# Altium footprint library MCU.PcbLib: 87 footprints (part 3 of 6)
Each footprint in its own frame and in the unit in brackets; x right, y up, seen from the top. Pads: shape width x height; smd on the part's side, far side on the other; paste and mask are expansions set on the pad; w line width, h text height; cw(c..) or ccw(c..) is an arc to the next point about the centre after c.
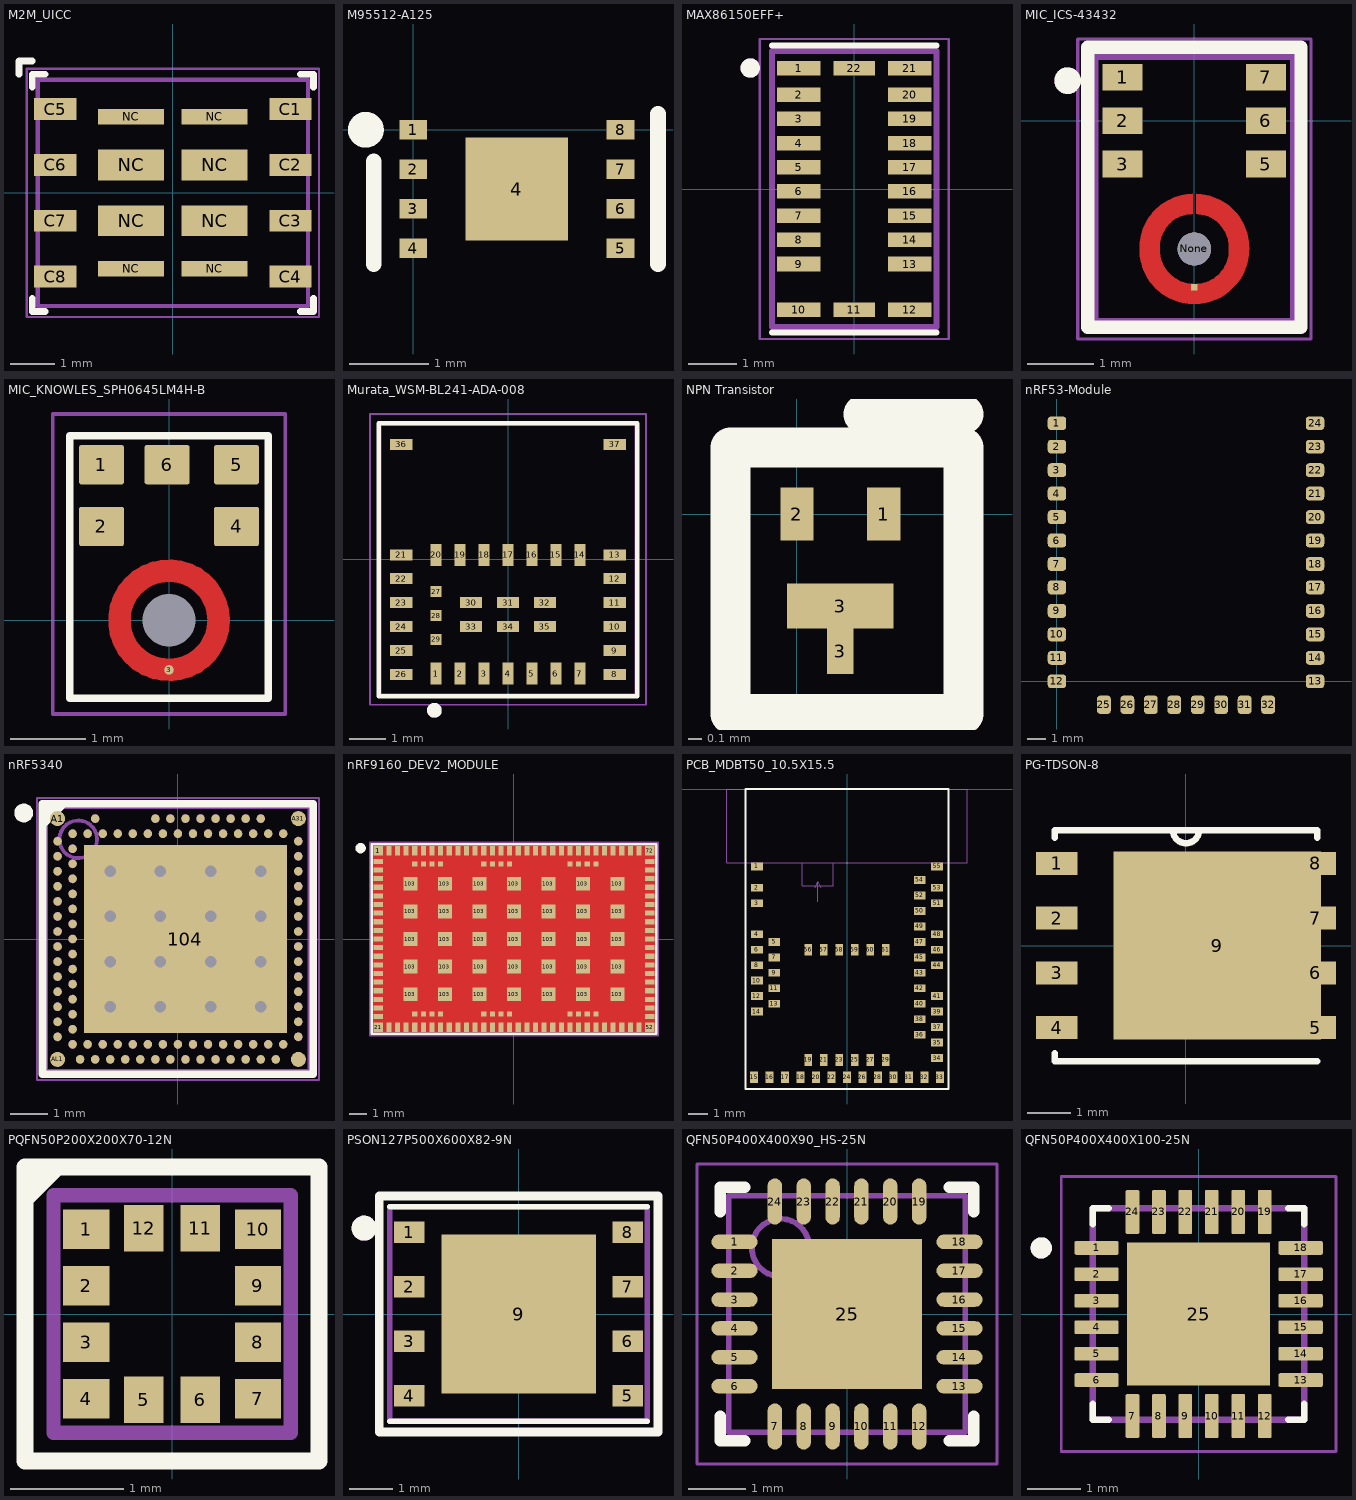
[diagram p2: the footprints below, top view; thin cyan lines are the x and y axes]

## M2M_UICC [mm]
pads (16):
  rect 0.96x0.5 smd: C1(2.675,1.905) C2(2.675,0.635) C3(2.675,-0.635) C4(2.675,-1.905) C5(-2.675,1.905) C6(-2.675,0.635) C7(-2.675,-0.635) C8(-2.675,-1.905)
  rect 1.5x0.7 smd: NC(-0.95,-0.635) NC(-0.95,0.635) NC(0.95,-0.635) NC(0.95,0.635)
  rect 1.5x0.35 smd: NC(-0.95,-1.73) NC(-0.95,1.73) NC(0.95,-1.73) NC(0.95,1.73)
Top Overlay:
  lines w0.15: -3.5,2.7 -3.5,3 -3.2,3 ; -3.2,-2.4 -3.2,-2.7 -2.9,-2.7 ; -3.2,2.4 -3.2,2.7 -2.9,2.7 ; 2.9,-2.7 3.2,-2.7 3.2,-2.4 ; 2.9,2.7 3.2,2.7 3.2,2.4
Mechanical 7:
  lines w0.1: -3.075,-2.575 -3.075,2.575 3.075,2.575 3.075,-2.575 -3.075,-2.575
Mechanical 15:
  circle w0.2: c-2.4,1.9 r0.05
  lines w0.05: -3.325,-2.825 -3.325,2.825 3.325,2.825 3.325,-2.825 -3.325,-2.825
3D body: height 0.5, standoff 0, extent -3.157,-2.674 3.175,2.667

## M95512-A125 [mm] "SPI EPROM"
pads (9):
  rect 0.35x0.25 smd: 1(0,0) 2(0,-0.5) 3(0,-1) 4(0,-1.5) 5(2.625,-1.5) 6(2.625,-1) 7(2.625,-0.5) 8(2.625,0)
  rect 1.3x1.3 smd: 4(1.312,-0.75)
Top Overlay:
  circle w0.254: c-0.6,0 r0.1
  lines w0.2: -0.5,-1.7 -0.5,-0.4 ; 3.1,-1.7 3.1,0.2
3D body "3D Model WFDFPN8.stp": height 0.75, standoff 0, extent -0.191,-1.75 2.809,0.25

## MAX86150EFF+ [mm] "BioSensor"
pads (22):
  rect 0.9x0.3 smd: 1(-1.15,2.5) 2(-1.15,1.95) 3(-1.15,1.45) 4(-1.15,0.95) 5(-1.15,0.45) 6(-1.15,-0.05) 7(-1.15,-0.55) 8(-1.15,-1.05) 9(-1.15,-1.55) 10(-1.15,-2.5) 12(1.15,-2.5) 13(1.15,-1.55) 14(1.15,-1.05) 15(1.15,-0.55) 16(1.15,-0.05) 17(1.15,0.45) 18(1.15,0.95) 19(1.15,1.45) 20(1.15,1.95) 21(1.15,2.5)
  rect 0.85x0.3 smd: 11(0,-2.5) 22(0,2.5)
Top Overlay:
  circle w0.2: c-2.15,2.5 r0.1
  lines w0.127: -1.7,-2.964 1.7,-2.964 ; -1.7,2.964 1.7,2.964
Mechanical 13:
  circle w0.2: c-2.15,2.5 r0.1
  lines w0.127: -1.7,-2.85 1.7,-2.85 1.7,2.85 -1.7,2.85 -1.7,-2.85
Mechanical 15:
  lines w0.05: -1.95,-3.1 1.95,-3.1 1.95,3.1 -1.95,3.1 -1.95,-3.1
3D body "MAX86150EFF---3DModel-STEP-56544.STEP": height 1.4, standoff 0, extent -1.65,-2.8 1.65,2.8

## MIC_ICS-43432 [mm]
pads (8):
  rect 0.6x0.4 smd: 1(-1.075,0.65) 2(-1.075,0) 3(-1.075,-0.65) 5(1.075,-0.65) 6(1.075,0) 7(1.075,0.65)
  rect 0.1x0.1 smd: 4(0,-2.5)
  round 0.5 hole 0.5 unplated: None(0,-1.925)
Top Layer:
  region: 249 vertices and 0 holes, not listed, extent -0.82,-2.75 0.82,-1.1
Top Overlay:
  circle w0.2: c-1.9,0.6 r0.1
  lines w0.2: -1.6,-3.1 -1.6,1.1 1.6,1.1 1.6,-3.1 -1.6,-3.1
Top Paste:
  drawing of 10 lines, arcs and shapes, not listed
Top Solder:
  circle w0.5: c0,-1.925 r0.67
Mechanical 4:
  circle w0.2: c-1.9,0.6 r0.1
  circle w0.2: c-1.9,0.6 r0.1
  lines w0.127: -1.5,-3.025 -1.5,0.975 ; -1.5,-3.025 1.5,-3.025 ; -1.5,-3.025 -1.5,0.975 ; -1.5,-3.025 1.5,-3.025 ; -1.5,0.975 1.5,0.975 ; -1.5,0.975 1.5,0.975 ; 1.5,-3.025 1.5,0.975 ; 1.5,-3.025 1.5,0.975
Mechanical 16:
  lines w0.05: -1.75,-3.275 -1.75,1.225 1.75,1.225 1.75,-3.275 -1.75,-3.275
3D body "ICS-43434.STEP": height 0.98, standoff 0, extent -1.325,-2.95 1.325,0.55

## MIC_KNOWLES_SPH0645LM4H-B [mm] "Microphone KNOWLES SPH0645LM4H-B (170120)"
height 1.08
pads (7):
  rrect10% 0.6x0.522 smd mask+0.05: 1(-0.9,2.074) 2(-0.9,1.252) 4(0.9,1.252) 5(0.9,2.074) 6(-0.025,2.074)
  round 0.127 smd paste+0 mask+0: 3(0,-0.662)
  round 0 hole 0.7 unplated mask+0.508: H1(0,0)
Top Layer:
  circle w0.3: c0,0 r0.662
Top Overlay:
  circle w0.1: c-0.9,2.074 r0.09
  lines w0.1: -1.325,-1.04 -1.325,2.46 1.325,2.46 1.325,-1.04 -1.325,-1.04
Top Paste:
  lines w0.3: -0.616,-0.254 cw(c-0.007,0.005) -0.616,0.263 ; -0.263,-0.616 ccw(c-0.005,-0.007) 0.254,-0.616 ; -0.254,0.616 cw(c0.005,0.007) 0.263,0.616 ; 0.616,-0.263 ccw(c0.007,-0.005) 0.616,0.254
Mechanical 15:
  lines w0.05: -0.2,0 0.2,0 ; 0,-0.2 0,0.2 ; -1.55,-1.25 -1.55,2.75 1.55,2.75 1.55,-1.25 -1.55,-1.25
3D body: height 1.01, standoff 0, extent -0.99,1.985 -0.81,2.165
3D body: height 0.28, standoff 0, extent -1.325,-1.05 1.325,2.45
3D body: height 0.98, standoff 0, extent -1.075,-0.75 1.075,2.15

## Murata_WSM-BL241-ADA-008 [mm]
pads (37):
  rect 0.3x0.6 smd: 1(-1.95,-3.1) 2(-1.3,-3.1) 3(-0.65,-3.1) 4(0,-3.1) 5(0.65,-3.1) 6(1.3,-3.1) 7(1.95,-3.1) 14(1.95,0.125) 15(1.3,0.125) 16(0.65,0.125) 17(0,0.125) 18(-0.65,0.125) 19(-1.3,0.125) 20(-1.95,0.125)
  rect 0.6x0.3 smd: 8(2.9,-3.125) 9(2.9,-2.475) 10(2.9,-1.825) 11(2.9,-1.175) 12(2.9,-0.525) 13(2.9,0.125) 21(-2.9,0.125) 22(-2.9,-0.525) 23(-2.9,-1.175) 24(-2.9,-1.825) 25(-2.9,-2.475) 26(-2.9,-3.125) 30(-1,-1.175) 31(0,-1.175) 32(1,-1.175) 33(-1,-1.825) 34(0,-1.825) 35(1,-1.825) 36(-2.9,3.125) 37(2.9,3.125)
  rect 0.3x0.3 smd: 27(-1.95,-0.875) 28(-1.95,-1.525) 29(-1.95,-2.175)
Top Overlay:
  circle w0.2: c-2,-4.1 r0.1
  lines w0.127: -3.515,-3.715 3.515,-3.715 3.515,3.7 -3.515,3.7 -3.515,-3.715
Mechanical 4:
  circle w0.2: c-2,-4.1 r0.1
  circle w0.2: c-2,-4.1 r0.1
  lines w0.127: -3.5,-3.7 -3.5,3.7 ; -3.5,-3.7 3.5,-3.7 ; -3.5,-3.7 -3.5,3.7 ; -3.5,-3.7 3.5,-3.7 ; -3.5,3.7 3.5,3.7 ; -3.5,3.7 3.5,3.7 ; 3.5,-3.7 3.5,3.7 ; 3.5,-3.7 3.5,3.7
Mechanical 16:
  lines w0.05: -3.75,-3.95 -3.75,3.95 3.75,3.95 3.75,-3.95 -3.75,-3.95
3D body: height 0.76, standoff 0, extent -3.505,-3.708 3.505,3.683

## NPN Transistor [mm] "BC847AQB"
pads (4):
  rect 0.25x0.4 smd: 1(0.65,0) 2(0,0)
  rect 0.2x0.34 smd: 3(0.325,-1.03)
  rect 0.8x0.34 smd: 3(0.325,-0.69)
Top Overlay:
  lines w0.3: 0.5,0.75 1.25,0.75 ; -0.5,-1.5 1.25,-1.5 1.25,0.5 -0.5,0.5 -0.5,-1.5
3D body: height 0.5, standoff 0, extent -0.179,-0.973 0.821,0.027

## nRF53-Module [mm] "Hand Solder version"
pads (32):
  rrect50% 1x0.75 smd: 1(0,13.97) 2(0,12.7) 3(0,11.43) 4(0,10.16) 5(0,8.89) 6(0,7.62) 7(0,6.35) 8(0,5.08) 9(0,3.81) 10(0,2.54) 11(0,1.27) 12(0,0) 13(13.97,0) 14(13.97,1.27) 15(13.97,2.54) 16(13.97,3.81) 17(13.97,5.08) 18(13.97,6.35) 19(13.97,7.62) 20(13.97,8.89) 21(13.97,10.16) 22(13.97,11.43) 23(13.97,12.7) 24(13.97,13.97)
  rrect50% 0.75x1 smd: 25(2.54,-1.27) 26(3.81,-1.27) 27(5.08,-1.27) 28(6.35,-1.27) 29(7.62,-1.27) 30(8.89,-1.27) 31(10.16,-1.27) 32(11.43,-1.27)
3D body "nRF53_Module v4.step": height 2.15, standoff -0.02, extent 0,-1.27 13.97,18.288

## nRF5340 [mm] "Nordic Semiconductor"
pads (115):
  rect 5.4x5 smd paste-5 mask+0.05: 104(0.2,0)
  round 0.4 smd paste+0.012 mask+0.05: A1(-3.2,3.2) A31(3.2,3.2) AL1(-3.2,-3.2) AL31(3.2,-3.2)
  round 0.225 smd paste+0.012 mask+0.05: A5(-2.2,3.2) A13(-0.6,3.2) A15(-0.2,3.2) A17(0.2,3.2) A19(0.6,3.2) A21(1,3.2) A23(1.4,3.2) A25(1.8,3.2) A27(2.2,3.2) AA1(-3.2,-1) AA31(3.2,-1) AB2(-2.8,-1.2) AC1(-3.2,-1.4) AC31(3.2,-1.4) AD2(-2.8,-1.6) AE1(-3.2,-1.8) AE31(3.2,-1.8) AF2(-2.8,-2) AG1(-3.2,-2.2) AG31(3.2,-2.2) AH2(-2.8,-2.4) AJ1(-3.2,-2.6) AJ31(3.2,-2.6) AK2(-2.8,-2.8) AK4(-2.4,-2.8) AK6(-2,-2.8) AK8(-1.6,-2.8) AK10(-1.2,-2.8) AK12(-0.8,-2.8) AK14(-0.4,-2.8) AK16(0,-2.8) AK18(0.4,-2.8) AK20(0.8,-2.8) AK22(1.2,-2.8) AK24(1.6,-2.8) AK26(2,-2.8) AK28(2.4,-2.8) AK30(2.8,-2.8) AL3(-2.6,-3.2) AL5(-2.2,-3.2) AL7(-1.8,-3.2) AL9(-1.4,-3.2) AL11(-1,-3.2) AL13(-0.6,-3.2) AL15(-0.2,-3.2) AL17(0.2,-3.2) AL19(0.6,-3.2) AL21(1,-3.2) AL23(1.4,-3.2) AL25(1.8,-3.2) AL27(2.2,-3.2) AL29(2.6,-3.2) B2(-2.8,2.8) B4(-2.4,2.8) B6(-2,2.8) B8(-1.6,2.8) B10(-1.2,2.8) B12(-0.8,2.8) B14(-0.4,2.8) B16(0,2.8) B18(0.4,2.8) B20(0.8,2.8) B22(1.2,2.8) B24(1.6,2.8) B26(2,2.8) B28(2.4,2.8) B30(2.8,2.8) C1(-3.2,2.6) C31(3.2,2.6) D2(-2.8,2.4) E1(-3.2,2.2) E31(3.2,2.2) F2(-2.8,2) G1(-3.2,1.8) G31(3.2,1.8) H2(-2.8,1.6) J1(-3.2,1.4) J31(3.2,1.4) K2(-2.8,1.2) L1(-3.2,1) L31(3.2,1) M2(-2.8,0.8) N1(-3.2,0.6) N31(3.2,0.6) P2(-2.8,0.4) R1(-3.2,0.2) R31(3.2,0.2) T2(-2.8,0) U1(-3.2,-0.2) U31(3.2,-0.2) V2(-2.8,-0.4) W1(-3.2,-0.6) W31(3.2,-0.6) Y2(-2.8,-0.8)
  rrect50% 1.1x1 on Top Paste: ""(-1.75,-1.8) ""(-1.75,-0.6) ""(-1.75,0.6) ""(-1.75,1.8) ""(-0.45,-1.8) ""(-0.45,-0.6) ""(-0.45,0.6) ""(-0.45,1.8) ""(0.85,-1.8) ""(0.85,-0.6) ""(0.85,0.6) ""(0.85,1.8) ""(2.15,-1.8) ""(2.15,-0.6) ""(2.15,0.6) ""(2.15,1.8)
via -1.8,1.8 diameter 0.61 hole 0.305
via -0.467,1.8 diameter 0.61 hole 0.305
via 0.867,1.8 diameter 0.61 hole 0.305
via 2.2,1.8 diameter 0.61 hole 0.305
via -1.8,0.6 diameter 0.61 hole 0.305
via -0.467,0.6 diameter 0.61 hole 0.305
via 0.867,0.6 diameter 0.61 hole 0.305
via 2.2,0.6 diameter 0.61 hole 0.305
via -1.8,-0.6 diameter 0.61 hole 0.305
via -0.467,-0.6 diameter 0.61 hole 0.305
via 0.867,-0.6 diameter 0.61 hole 0.305
via 2.2,-0.6 diameter 0.61 hole 0.305
via -1.8,-1.8 diameter 0.61 hole 0.305
via -0.467,-1.8 diameter 0.61 hole 0.305
via 0.867,-1.8 diameter 0.61 hole 0.305
via 2.2,-1.8 diameter 0.61 hole 0.305
Top Overlay:
  circle w0.25: c-4.1,3.35 r0.125
  region: -3,3.5 -3.5,3 -3.5,3.5
  lines w0.2: -3.6,-3.6 -3.6,3.6 3.6,3.6 3.6,-3.6 -3.6,-3.6
Mechanical 5:
  drawing of 564 lines, arcs and shapes, not listed
  text "AG1" at -3.541,-2.24 h0.08
  text "AJ1" at -3.541,-2.64 h0.08
  text "AH2" at -3.208,-2.44 h0.08
  text "AK4" at -2.508,-3.039 h0.08
  text "AL5" at -2.315,-3.439 h0.08
  text "AK2" at -2.908,-3.013 h0.08
  text "AL3" at -2.715,-3.439 h0.08
  text "V2" at -3.128,-0.44 h0.08
  text "U1" at -3.469,-0.24 h0.08
  text "Y2" at -3.128,-0.84 h0.08
  text "AA1" at -3.534,-1.04 h0.08
  text "W1" at -3.469,-0.64 h0.08
  text "AD2" at -3.208,-1.64 h0.08
  text "AC1" at -3.541,-1.44 h0.08
  text "AE1" at -3.521,-1.84 h0.08
  text "AB2" at -3.208,-1.24 h0.08
  text "H2" at -3.128,1.56 h0.08
  text "J1" at -3.469,1.36 h0.08
  text "G1" at -3.469,1.76 h0.08
  text "M2" at -3.128,0.76 h0.08
  text "L1" at -3.489,0.96 h0.08
  text "P2" at -3.128,0.36 h0.08
  text "R1" at -3.456,0.16 h0.08
  text "N1" at -3.449,0.56 h0.08
  text "K2" at -3.128,1.16 h0.08
  text "D2" at -3.128,2.36 h0.08
  text "E1" at -3.449,2.16 h0.08
  text "C1" at -3.469,2.56 h0.08
  text "B4" at -2.469,2.961 h0.08
  text "A5" at -2.272,3.361 h0.08
  text "B2" at -2.853,2.947 h0.08
  text "AK14" at -0.538,-3.039 h0.08
  text "AL13" at -0.744,-3.439 h0.08
  text "AK10" at -1.338,-3.04 h0.08
  text "AL11" at -1.144,-3.439 h0.08
  text "AK12" at -0.938,-3.039 h0.08
  text "AK8" at -1.708,-3.039 h0.08
  text "AL7" at -1.915,-3.439 h0.08
  text "AL9" at -1.544,-3.439 h0.08
  text "AL15" at -0.344,-3.439 h0.08
  text "B14" at -0.498,2.961 h0.08
  text "A13" at -0.702,3.36 h0.08
  text "B10" at -1.298,2.961 h0.08
  text "B12" at -0.898,2.961 h0.08
  text "B8" at -1.669,2.961 h0.08
  text "A15" at -0.302,3.361 h0.08
  text "AK24" at 1.462,-3.039 h0.08
  text "AL23" at 1.256,-3.439 h0.08
  text "AL25" at 1.656,-3.439 h0.08
  text "AK20" at 0.662,-3.04 h0.08
  text "AL21" at 0.856,-3.439 h0.08
  text "AK18" at 0.262,-3.039 h0.08
  text "AL17" at 0.056,-3.439 h0.08
  text "AL19" at 0.456,-3.439 h0.08
  text "AK22" at 1.062,-3.039 h0.08
  text "B24" at 1.502,2.961 h0.08
  text "A23" at 1.298,3.36 h0.08
  text "A25" at 1.698,3.361 h0.08
  text "B20" at 0.702,2.961 h0.08
  text "A21" at 0.898,3.36 h0.08
  text "B18" at 0.302,2.961 h0.08
  text "A17" at 0.098,3.361 h0.08
  text "A19" at 0.498,3.361 h0.08
  text "B22" at 1.102,2.961 h0.08
  text "AL29" at 2.456,-3.439 h0.08
  text "AL27" at 2.056,-3.439 h0.08
  text "AK28" at 2.262,-3.039 h0.08
  text "AG31" at 3.322,-2.24 h0.08
  text "AJ31" at 3.322,-2.64 h0.08
  text "AK30" at 2.662,-3.039 h0.08
  text "U31" at 3.322,-0.24 h0.08
  text "AA31" at 3.322,-1.04 h0.08
  text "W31" at 3.322,-0.64 h0.08
  text "AC31" at 3.322,-1.44 h0.08
  text "AE31" at 3.322,-1.84 h0.08
  text "J31" at 3.322,1.36 h0.08
  text "G31" at 3.322,1.76 h0.08
  text "L31" at 3.322,0.96 h0.08
  text "R31" at 3.322,0.16 h0.08
  text "N31" at 3.322,0.56 h0.08
  text "E31" at 3.322,2.16 h0.08
  text "C31" at 3.322,2.56 h0.08
  text "B30" at 2.702,2.961 h0.08
  text "A27" at 2.098,3.361 h0.08
  text "B28" at 2.302,2.961 h0.08
  text "AF2" at -3.208,-2.04 h0.08
  text "F2" at -3.128,1.96 h0.08
  text "T2" at -3.128,-0.04 h0.08
  text "AK6" at -2.108,-3.039 h0.08
  text "B6" at -2.069,2.961 h0.08
  text "AK26" at 1.862,-3.039 h0.08
  text "AK16" at -0.138,-3.039 h0.08
  text "B26" at 1.902,2.961 h0.08
  text "B16" at -0.098,2.961 h0.08
Mechanical 7:
  circle w0.1: c-2.65,2.65 r0.5
  lines w0.1: -3.5,-3.5 3.5,-3.5 3.5,3.5 -3.5,3.5 -3.5,-3.5
  text ".Designator" at -3.2,-0.3 h0.64
Mechanical 15:
  lines w0.05: -3.75,-3.75 3.75,-3.75 3.75,3.75 -3.75,3.75 -3.75,-3.75
  lines w0.1: -0.3,0 0.7,0 ; 0.2,-0.5 0.2,0.5
3D body "aQFN-116 (7x7).step": height 0.85, standoff -0.05, extent -3.5,-3.5 3.5,3.5

## nRF9160_DEV2_MODULE [mm]
pads (161):
  rect 0.54x0.54 smd mask+0.05: 1(-7.87,5.12) 21(-7.87,-5.12) 52(7.87,-5.12) 72(7.87,5.12)
  rect 0.54x0.3 smd mask+0.05: 2(-7.87,4.5) 3(-7.87,4) 4(-7.87,3.5) 5(-7.87,3) 6(-7.87,2.5) 7(-7.87,2) 8(-7.87,1.5) 9(-7.87,1) 10(-7.87,0.5) 11(-7.87,0) 12(-7.87,-0.5) 13(-7.87,-1) 14(-7.87,-1.5) 15(-7.87,-2) 16(-7.87,-2.5) 17(-7.87,-3) 18(-7.87,-3.5) 19(-7.87,-4) 20(-7.87,-4.5) 53(7.87,-4.5) 54(7.87,-4) 55(7.87,-3.5) 56(7.87,-3) 57(7.87,-2.5) 58(7.87,-2) 59(7.87,-1.5) 60(7.87,-1) 61(7.87,-0.5) 62(7.87,0) 63(7.87,0.5) 64(7.87,1) 65(7.87,1.5) 66(7.87,2) 67(7.87,2.5) 68(7.87,3) 69(7.87,3.5) 70(7.87,4) 71(7.87,4.5)
  rect 0.3x0.54 smd mask+0.05: 22(-7.25,-5.12) 23(-6.75,-5.12) 24(-6.25,-5.12) 25(-5.75,-5.12) 26(-5.25,-5.12) 27(-4.75,-5.12) 28(-4.25,-5.12) 29(-3.75,-5.12) 30(-3.25,-5.12) 31(-2.75,-5.12) 32(-2.25,-5.12) 33(-1.75,-5.12) 34(-1.25,-5.12) 35(-0.75,-5.12) 36(-0.25,-5.12) 37(0.25,-5.12) 38(0.75,-5.12) 39(1.25,-5.12) 40(1.75,-5.12) 41(2.25,-5.12) 42(2.75,-5.12) 43(3.25,-5.12) 44(3.75,-5.12) 45(4.25,-5.12) 46(4.75,-5.12) 47(5.25,-5.12) 48(5.75,-5.12) 49(6.25,-5.12) 50(6.75,-5.12) 51(7.25,-5.12) 73(7.25,5.12) 74(6.75,5.12) 75(6.25,5.12) 76(5.75,5.12) 77(5.25,5.12) 78(4.75,5.12) 79(4.25,5.12) 80(3.75,5.12) 81(3.25,5.12) 82(2.75,5.12) 83(2.25,5.12) 84(1.75,5.12) 85(1.25,5.12) 86(0.75,5.12) 87(0.25,5.12) 88(-0.25,5.12) 89(-0.75,5.12) 90(-1.25,5.12) 91(-1.75,5.12) 92(-2.25,5.12) 93(-2.75,5.12) 94(-3.25,5.12) 95(-3.75,5.12) 96(-4.25,5.12) 97(-4.75,5.12) 98(-5.25,5.12) 99(-5.75,5.12) 100(-6.25,5.12) 101(-6.75,5.12) 102(-7.25,5.12)
  rect 0.8x0.8 smd mask+0.05: 103(-6,-3.2) 103(-6,-1.6) 103(-6,0) 103(-6,1.6) 103(-6,3.2) 103(-4,-3.2) 103(-4,-1.6) 103(-4,0) 103(-4,1.6) 103(-4,3.2) 103(-2,-3.2) 103(-2,-1.6) 103(-2,0) 103(-2,1.6) 103(-2,3.2) 103(0,-3.2) 103(0,-1.6) 103(0,0) 103(0,1.6) 103(0,3.2) 103(2,-3.2) 103(2,-1.6) 103(2,0) 103(2,1.6) 103(2,3.2) 103(4,-3.2) 103(4,-1.6) 103(4,0) 103(4,1.6) 103(4,3.2) 103(6,-3.2) 103(6,-1.6) 103(6,0) 103(6,1.6) 103(6,3.2)
  rect 0.3x0.3 smd mask+0.05: 104(-5.75,-4.35) 105(-5.25,-4.35) 106(-4.75,-4.35) 107(-4.25,-4.35) 108(-1.75,-4.35) 109(-1.25,-4.35) 110(-0.75,-4.35) 111(-0.25,-4.35) 112(3.25,-4.35) 113(3.75,-4.35) 114(4.25,-4.35) 115(4.75,-4.35) 116(4.75,4.35) 117(4.25,4.35) 118(3.75,4.35) 119(3.25,4.35) 120(-0.25,4.35) 121(-0.75,4.35) 122(-1.25,4.35) 123(-1.75,4.35) 124(-4.25,4.35) 125(-4.75,4.35) 126(-5.25,4.35) 127(-5.75,4.35)
Top Layer:
  pour cut-out: -8.15,5.4 8.15,5.4 8.15,-5.4 -8.15,-5.4
Top Overlay:
  circle w0.3: c-8.89,5.265 r0.15
  lines w0.15: -8.25,-5.5 -8.25,5.5 8.25,5.5 8.25,-5.5 -8.25,-5.5
Mechanical 5:
  text ".Comment" at -5.4,-2.45 h0.9
Mechanical 7:
  circle w0.3: c-6.5,3.75 r0.15
  lines w0.1: -8.05,-5.3 -8.05,5.3 8.05,5.3 8.05,-5.3 -8.05,-5.3
  text ".Designator" at -0.878,-0.289 h1.5
Mechanical 15:
  circle w0.3: c-6.5,3.75 r0.15
  lines w0.1: -8.35,-5.6 -8.35,5.6 8.35,5.6 8.35,-5.6 -8.35,-5.6
3D body "nRF9160_v4.step": height 1.2, standoff 0, extent -8.05,-5.3 8.05,5.3

## PCB_MDBT50_10.5X15.5 [mm]
pads (61):
  rect 0.6x0.4 smd mask+0.05: 1(-4.65,-4) 2(-4.65,-5.1) 3(-4.65,-5.9) 4(-4.65,-7.5) 5(-3.75,-7.9) 6(-4.65,-8.3) 7(-3.75,-8.7) 8(-4.65,-9.1) 9(-3.75,-9.5) 10(-4.65,-9.9) 11(-3.75,-10.3) 12(-4.65,-10.7) 13(-3.75,-11.1) 14(-4.65,-11.5) 34(4.65,-13.9) 35(4.65,-13.1) 36(3.75,-12.7) 37(4.65,-12.3) 38(3.75,-11.9) 39(4.65,-11.5) 40(3.75,-11.1) 41(4.65,-10.7) 42(3.75,-10.3) 43(3.75,-9.5) 44(4.65,-9.1) 45(3.75,-8.7) 46(4.65,-8.3) 47(3.75,-7.9) 48(4.65,-7.5) 49(3.75,-7.1) 50(3.75,-6.3) 51(4.65,-5.9) 52(3.75,-5.5) 53(4.65,-5.1) 54(3.75,-4.7) 55(4.65,-4)
  rect 0.4x0.6 smd mask+0.05: 15(-4.8,-14.9) 16(-4,-14.9) 17(-3.2,-14.9) 18(-2.4,-14.9) 19(-2,-14) 20(-1.6,-14.9) 21(-1.2,-14) 22(-0.8,-14.9) 23(-0.4,-14) 24(0,-14.9) 25(0.4,-14) 26(0.8,-14.9) 27(1.2,-14) 28(1.6,-14.9) 29(2,-14) 30(2.4,-14.9) 31(3.2,-14.9) 32(4,-14.9) 33(4.8,-14.9) 56(-2,-8.3) 57(-1.2,-8.3) 58(-0.4,-8.3) 59(0.4,-8.3) 60(1.2,-8.3) 61(2,-8.3)
Top Overlay:
  lines w0.1: -5.25,-15.5 -5.25,0 0,0 5.25,0 5.25,-15.5 -5.25,-15.5
Mechanical 2:
  lines w0.05: -6.2,-3.8 6.2,-3.8 6.2,0 -6.2,0 -6.2,-3.8
  text "No ground pad" at -2.801,-1.775 h0.45
Mechanical 3:
  lines w0.05: -1.65,-5.098 -1.5,-4.798 ; -1.5,-5.823 -1.5,-4.798 ; -1.35,-5.098 -1.5,-4.798 ; -2.3,-5 -0.7,-5 -0.7,-3.8 -2.3,-3.8 -2.3,-5
  text "Toplayer no ground pad" at -3.4,-6.225 h0.3
3D body "MDBT50Q 3D Drawing_20180620.stp": height 2.05, standoff 0, extent -5.3,-15.55 5.2,-0.05

## PG-TDSON-8 [mil]
pads (9):
  rect 38x21 smd: 1(-118,75) 2(-118,25) 3(-118,-25) 4(-118,-75) 5(118,-75) 6(118,-25) 7(118,25) 8(118,75)
  rect 189.17x171.65 smd mask+0: 9(28.54,0)
Top Overlay:
  lines w6: -120,-98.6 -120,-105.5 120,-105.5 ; -120,98.6 -120,105.5 120,105.5 120,98.6 ; -12,105.5 ccw(c0,105.5) 12,105.5
Top Paste:
  region: -58.26,-86.5 -58.26,86.5 107.09,86.5 107.09,-86.5
Top Solder:
  region: -58.26,-86.5 -58.26,86.5 107.09,86.5 107.09,-86.5
3D body "Infineon-STP_PG-TDSON-8-17-P-v01_00-EN.stp": height 39.76, standoff 0, extent -121.06,-101.39 121.07,101.37

## PQFN50P200X200X70-12N [mm]
pads (12):
  rect 0.41x0.35 smd: 1(-0.76,0.75) 2(-0.76,0.25) 3(-0.76,-0.25) 4(-0.76,-0.75) 7(0.76,-0.75) 8(0.76,-0.25) 9(0.76,0.25) 10(0.76,0.75)
  rect 0.35x0.41 smd: 5(-0.25,-0.76) 6(0.25,-0.76) 11(0.25,0.76) 12(-0.25,0.76)
Top Overlay:
  region: -1.232,0.978 -0.978,1.232 -1.119,1.373 -1.373,1.119
  lines w0.15: -1.3,-1.3 -1.3,1.3 1.3,1.3 1.3,-1.3 -1.3,-1.3
Mechanical 4:
  lines w0.127: -1.05,-1.05 -1.05,1.05 ; -1.05,-1.05 1.05,-1.05 ; -1.05,-1.05 -1.05,1.05 ; -1.05,-1.05 1.05,-1.05 ; -1.05,1.05 1.05,1.05 ; -1.05,1.05 1.05,1.05 ; 1.05,-1.05 1.05,1.05 ; 1.05,-1.05 1.05,1.05
Mechanical 16:
  lines w0.05: -1.3,-1.3 1.3,-1.3 1.3,1.3 -1.3,1.3 -1.3,-1.3
3D body "IIS2MDCTR--3DModel-STEP-56544.STEP": height 0.7, standoff 0, extent -1,-1 1,1

## PSON127P500X600X82-9N [mm]
pads (9):
  rect 0.71x0.51 smd: 1(-2.55,1.905) 2(-2.55,0.635) 3(-2.55,-0.635) 4(-2.55,-1.905) 5(2.55,-1.905) 6(2.55,-0.635) 7(2.55,0.635) 8(2.55,1.905)
  rect 3.6x3.7 smd paste-3: 9(0,0)
Top Overlay:
  circle w0.3: c-3.6,2 r0.141
  lines w0.127: -3,-2.5 3,-2.5 ; -3,2.5 3,2.5
  lines w0.2: -3.25,-2.75 -3.25,2.75 3.25,2.75 3.25,-2.75 -3.25,-2.75
Top Paste:
  region: 1.5,-1.45 0.18,-1.45 0.18,-0.18 1.5,-0.18
  region: -0.18,-1.45 -1.5,-1.45 -1.5,-0.18 -0.18,-0.18
  region: 1.5,0.18 0.18,0.18 0.18,1.45 1.5,1.45
  region: -0.18,0.18 -1.5,0.18 -1.5,1.45 -0.18,1.45
Mechanical 13:
  circle w0.3: c-3.6,2 r0.141
  lines w0.127: -3,-2.5 -3,2.5 3,2.5 3,-2.5 -3,-2.5
3D body "SIM-ST-MFF2--3DModel-STEP-56544.STEP": height 0.82, standoff 0, extent -3,-2.5 3,2.5

## QFN50P400X400X90_HS-25N [mm] "QFN, 24-Leads, Body 4.00x4.00mm, Pitch 0.50mm, Thermal Pad 2.60x2.70mm, IPC Medium Density"
height 0.9
pads (25):
  oval 0.8x0.25 smd: 1(-1.95,1.25) 2(-1.95,0.75) 3(-1.95,0.25) 4(-1.95,-0.25) 5(-1.95,-0.75) 6(-1.95,-1.25) 13(1.95,-1.25) 14(1.95,-0.75) 15(1.95,-0.25) 16(1.95,0.25) 17(1.95,0.75) 18(1.95,1.25)
  oval 0.25x0.8 smd: 7(-1.25,-1.95) 8(-0.75,-1.95) 9(-0.25,-1.95) 10(0.25,-1.95) 11(0.75,-1.95) 12(1.25,-1.95) 19(1.25,1.95) 20(0.75,1.95) 21(0.25,1.95) 22(-0.25,1.95) 23(-0.75,1.95) 24(-1.25,1.95)
  rect 2.6x2.6 smd: 25(0,0)
Top Overlay:
  lines w0.2: -2.2,-1.775 -2.2,-2.2 -1.775,-2.2 ; -2.2,1.775 -2.2,2.2 -1.775,2.2 ; 1.775,-2.2 2.2,-2.2 2.2,-1.775 ; 1.775,2.2 2.2,2.2 2.2,1.775
Mechanical 13:
  circle w0.1: c-1.15,1.15 r0.5
  lines w0.1: -2.05,-2.05 2.05,-2.05 2.05,2.05 -2.05,2.05 -2.05,-2.05
Mechanical 15:
  lines w0.05: -2.6,-2.6 2.6,-2.6 2.6,2.6 -2.6,2.6 -2.6,-2.6
  lines w0.1: -0.5,0 0.5,0 ; 0,-0.5 0,0.5
3D body "QFN50P400X400X90_HS-25N.step": height 0.9, standoff 0, extent -2.051,-2.051 2.051,2.051

## QFN50P400X400X100-25N [mm]
pads (25):
  rrect25% 0.84x0.26 smd: 1(-1.93,1.25) 2(-1.93,0.75) 3(-1.93,0.25) 4(-1.93,-0.25) 5(-1.93,-0.75) 6(-1.93,-1.25) 13(1.93,-1.25) 14(1.93,-0.75) 15(1.93,-0.25) 16(1.93,0.25) 17(1.93,0.75) 18(1.93,1.25)
  rrect25% 0.26x0.84 smd: 7(-1.25,-1.93) 8(-0.75,-1.93) 9(-0.25,-1.93) 10(0.25,-1.93) 11(0.75,-1.93) 12(1.25,-1.93) 19(1.25,1.93) 20(0.75,1.93) 21(0.25,1.93) 22(-0.25,1.93) 23(-0.75,1.93) 24(-1.25,1.93)
  rect 2.7x2.7 smd paste-0.5: 25(0,0)
Top Overlay:
  circle w0.2: c-2.975,1.25 r0.1
  lines w0.127: -2,-1.7 -2,-2 -1.7,-2 ; -2,1.7 -2,2 -1.7,2 ; 1.7,-2 2,-2 2,-1.7 ; 1.7,2 2,2 2,1.7
Mechanical 13:
  circle w0.2: c-2.975,1.25 r0.1
  lines w0.127: -2,-2 -2,2 2,2 2,-2 -2,-2
Mechanical 15:
  lines w0.05: -2.6,-2.6 -2.6,2.6 2.6,2.6 2.6,-2.6 -2.6,-2.6
3D body "step_temp.STEP": height 0.95, standoff -0.05, extent -2,-2 2,2